# Altium footprint library LSCB.PcbLib: 64 footprints (part 3 of 4)
Each footprint in its own frame and in the unit in brackets; x right, y up, seen from the top. Pads: shape width x height; smd on the part's side, far side on the other; paste and mask are expansions set on the pad; w line width, h text height; cw(c..) or ccw(c..) is an arc to the next point about the centre after c.
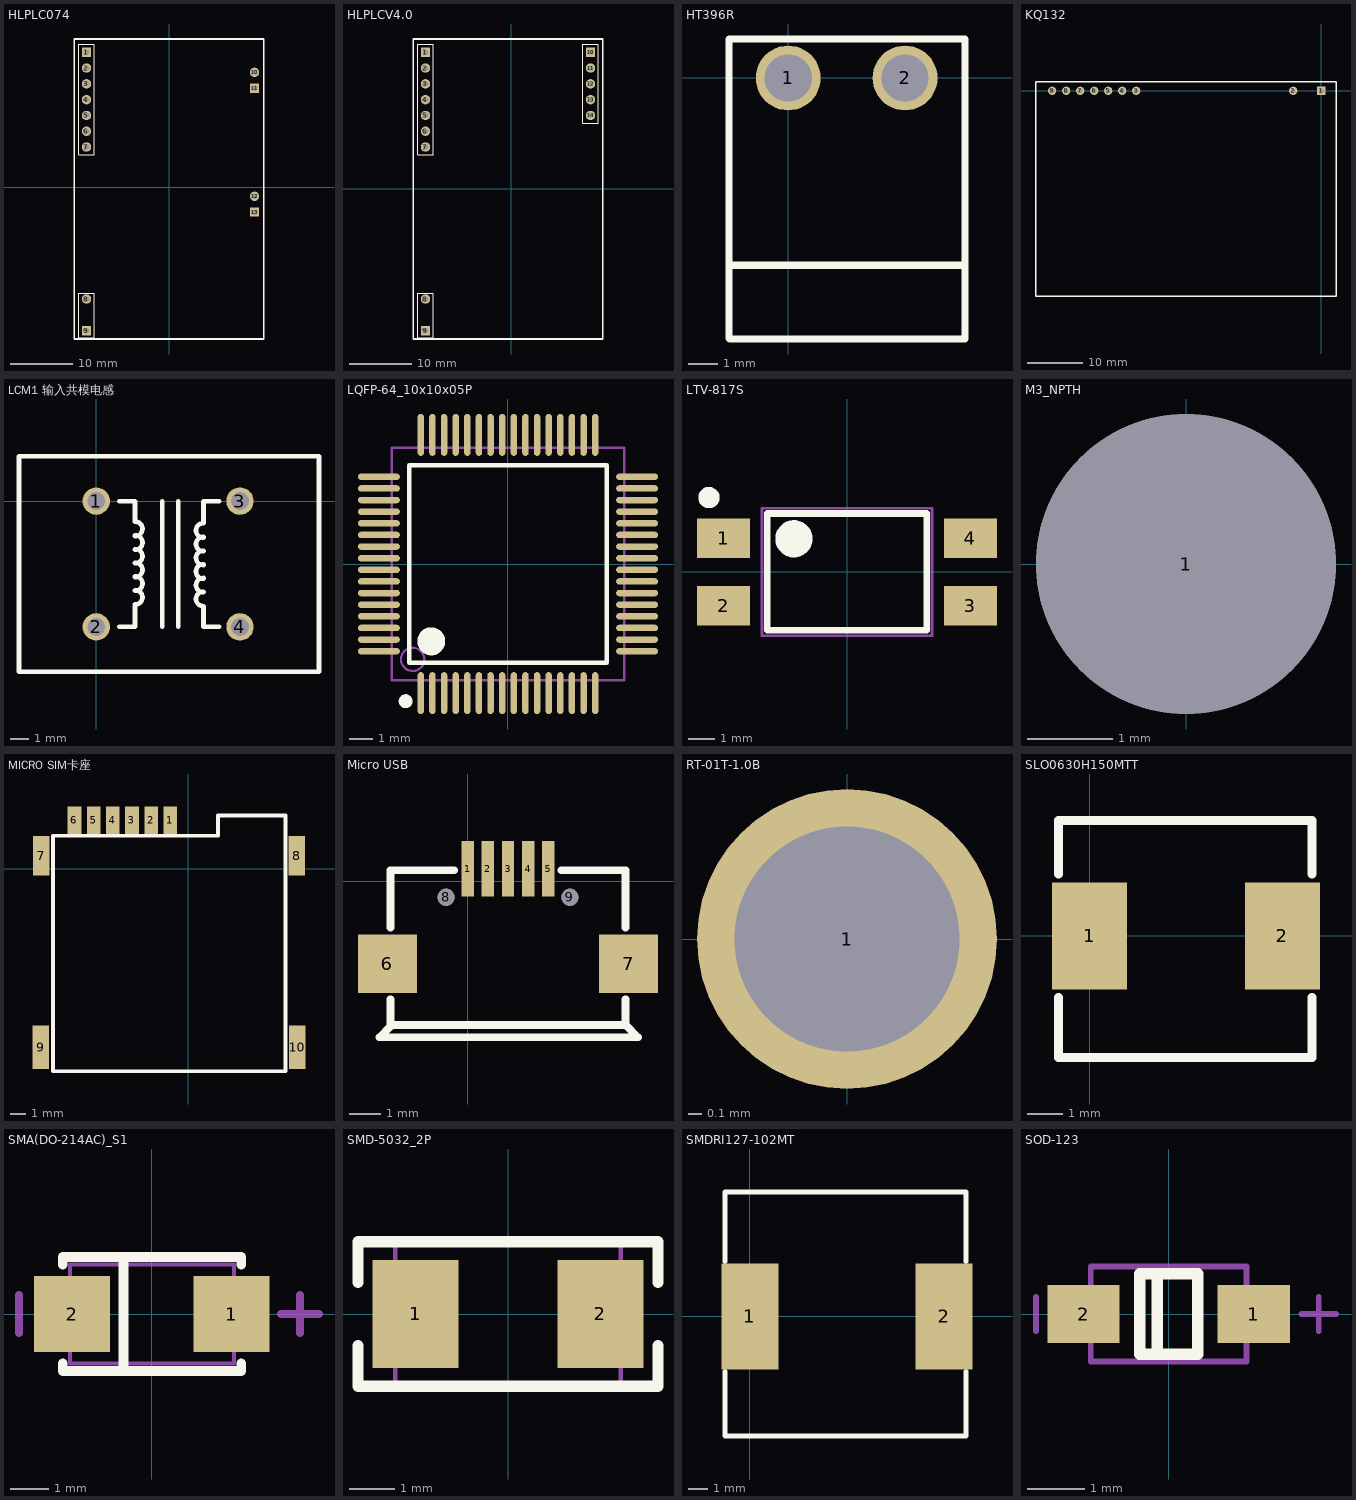
[diagram p2: the footprints below, top view; thin cyan lines are the x and y axes]

## HLPLC074 [mm]
pads (13):
  rect 1.5x1.5 hole 0.9: 1(-13.284,21.742) 9(-13.284,-23.038) 11(13.741,15.977) 13(13.741,-3.962)
  round 1.5 hole 0.9: 2(-13.284,19.202) 3(-13.284,16.662) 4(-13.284,14.122) 5(-13.284,11.582) 6(-13.284,9.042) 7(-13.284,6.502) 8(-13.284,-17.958) 10(13.741,18.517) 12(13.741,-1.422)
Top Overlay:
  lines w0.2: -14.554,-24.206 -14.554,-17.018 -12.014,-17.018 -12.014,-24.206 -14.554,-24.206 ; -14.554,5.232 -12.014,5.232 -12.014,23.012 -14.554,23.012 -14.554,5.232
  lines w0.254: -15.265,-24.384 -15.265,23.876 15.24,23.876 15.24,-24.384 -15.265,-24.384
Bottom Overlay:
  lines w0.2: 12.471,-5.232 15.011,-5.232 15.011,-0.152 12.471,-0.152 12.471,-5.232 ; 12.471,14.707 15.011,14.707 15.011,19.787 12.471,19.787 12.471,14.707

## HLPLCV4.0 [mm]
pads (14):
  rect 1.5x1.5 hole 0.9: 1(-13.792,21.996) 9(-13.792,-22.784) 10(12.751,21.996)
  round 1.5 hole 0.9: 2(-13.792,19.456) 3(-13.792,16.916) 4(-13.792,14.376) 5(-13.792,11.836) 6(-13.792,9.296) 7(-13.792,6.756) 8(-13.792,-17.704) 11(12.751,19.456) 12(12.751,16.916) 13(12.751,14.376) 14(12.751,11.836)
Top Overlay:
  lines w0.2: -15.062,-23.952 -12.522,-23.952 -12.522,-16.764 -15.062,-16.764 -15.062,-23.952 ; -15.062,5.486 -15.062,23.266 -12.522,23.266 -12.522,5.486 -15.062,5.486 ; 11.481,10.566 11.481,23.266 14.021,23.266 14.021,10.566 11.481,10.566
  lines w0.254: -15.773,-24.13 14.732,-24.13 14.732,24.13 -15.773,24.13 -15.773,-24.13

## HT396R [mm] "3.96mm 2p"
pads (2):
  round 2.2 hole 1.6: 1(0,0) 2(3.96,0)
Top Overlay:
  lines w0.254: -1.981,-6.35 5.944,-6.35 ; -2.007,-8.823 -1.986,-8.844 5.99,-8.844 5.99,1.321 -2.007,1.321 -2.007,-8.823

## KQ132 [mm]
pads (9):
  rect 1.5x1.5 hole 0.9: 1(0,0)
  round 1.5 hole 0.9: 2(-5.08,0) 3(-33.528,0) 4(-36.068,0) 5(-38.608,0) 6(-41.148,0) 7(-43.688,0) 8(-46.228,0) 9(-48.768,0)
Top Overlay:
  lines w0.254: -51.689,-37.226 -51.689,1.636 2.667,1.636 2.667,-37.226 -51.689,-37.226
3D body "KQ130F.SLDPRT": height 17.1, standoff -3, extent -50.535,-36.166 2.465,1.834

## LCM1 输入共模电感 [mm]
pads (4):
  round 1.524 hole 1: 1(0,0) 2(0,-7) 3(8,0) 4(8,-7)
Top Overlay:
  lines w0.254: 1.27,-6.985 2.159,-6.985 2.159,-5.842 ; 1.27,0 2.159,0 2.159,-1.143 cw(c2.176,-1.543) 2.157,-1.942 ; 2.157,-5.752 ccw(c2.176,-5.353) 2.159,-4.953 ; 2.157,-4.99 ccw(c2.176,-4.591) 2.159,-4.191 ; 2.157,-4.228 ccw(c2.176,-3.829) 2.159,-3.429 ; 2.157,-3.466 ccw(c2.176,-3.067) 2.159,-2.667 ; 2.157,-2.704 ccw(c2.176,-2.305) 2.159,-1.905 ; 3.683,-6.985 3.683,0 ; 4.572,-6.985 4.572,0 ; 5.969,-5.08 cw(c5.952,-4.68) 5.971,-4.281 ; 5.969,-4.318 cw(c5.952,-3.918) 5.971,-3.519 ; 5.969,-3.556 cw(c5.952,-3.156) 5.971,-2.757 ; 5.969,-2.794 cw(c5.952,-2.394) 5.971,-1.995 ; 5.969,-2.032 cw(c5.952,-1.632) 5.971,-1.233 ; 5.969,-1.143 5.969,0 6.858,0 ; 5.971,-5.043 ccw(c5.952,-5.442) 5.969,-5.842 5.969,-6.985 6.858,-6.985 ; -4.3,-9.5 12.4,-9.5 12.4,2.5 -4.3,2.5 -4.3,-9.5
3D body "User Library-UF9_8.SLDPRT": height 15.3, standoff -3, extent -4.064,-8.729 12.09,1.871

## LQFP-64_10x10x05P [mm]
pads (64):
  oval 0.28x1.8 smd mask+0.051: 1(-3.75,-5.55) 2(-3.25,-5.55) 3(-2.75,-5.55) 4(-2.25,-5.55) 5(-1.75,-5.55) 6(-1.25,-5.55) 7(-0.75,-5.55) 8(-0.25,-5.55) 9(0.25,-5.55) 10(0.75,-5.55) 11(1.25,-5.55) 12(1.75,-5.55) 13(2.25,-5.55) 14(2.75,-5.55) 15(3.25,-5.55) 16(3.75,-5.55) 33(3.75,5.55) 34(3.25,5.55) 35(2.75,5.55) 36(2.25,5.55) 37(1.75,5.55) 38(1.25,5.55) 39(0.75,5.55) 40(0.25,5.55) 41(-0.25,5.55) 42(-0.75,5.55) 43(-1.25,5.55) 44(-1.75,5.55) 45(-2.25,5.55) 46(-2.75,5.55) 47(-3.25,5.55) 48(-3.75,5.55)
  oval 1.8x0.28 smd mask+0.051: 17(5.55,-3.75) 18(5.55,-3.25) 19(5.55,-2.75) 20(5.55,-2.25) 21(5.55,-1.75) 22(5.55,-1.25) 23(5.55,-0.75) 24(5.55,-0.25) 25(5.55,0.25) 26(5.55,0.75) 27(5.55,1.25) 28(5.55,1.75) 29(5.55,2.25) 30(5.55,2.75) 31(5.55,3.25) 32(5.55,3.75) 49(-5.55,3.75) 50(-5.55,3.25) 51(-5.55,2.75) 52(-5.55,2.25) 53(-5.55,1.75) 54(-5.55,1.25) 55(-5.55,0.75) 56(-5.55,0.25) 57(-5.55,-0.25) 58(-5.55,-0.75) 59(-5.55,-1.25) 60(-5.55,-1.75) 61(-5.55,-2.25) 62(-5.55,-2.75) 63(-5.55,-3.25) 64(-5.55,-3.75)
Top Overlay:
  circle w0.6: c-3.3,-3.325 r0.3
  circle w0.3: c-4.4,-5.9 r0.15
  lines w0.2: -4.25,-4.25 -4.25,4.25 4.25,4.25 4.25,-4.25 -4.25,-4.25
Mechanical 13:
  circle w0.1: c-4.1,-4.1 r0.5
  lines w0.1: -5,-5 -5,5 5,5 5,-5 -5,-5
3D body "ST LQFP-64-10x10.STEP": height 1.6, standoff 0, extent -6.01,-6.01 6.011,6.011

## LTV-817S [mm] "光耦"
pads (4):
  rect 2x1.5 smd: 1(-4.65,1.27) 2(-4.65,-1.27) 3(4.65,-1.27) 4(4.65,1.27)
Top Overlay:
  circle w0.4: c-5.2,2.8 r0.2
  circle w0.7: c-2,1.25 r0.35
  lines w0.254: -3,-2.2 -3,2.2 3,2.2 3,-2.2 -3,-2.2
Mechanical 13:
  lines w0.1: -3.2,-2.4 3.2,-2.4 3.2,2.4 -3.2,2.4 -3.2,-2.4
3D body "User Library-DIP4_opto_iso.STEP": height 3.9, standoff 0, extent -5.015,-2.416 5.015,2.416

## M3_NPTH [mm]
pads (1):
  round 3.5 hole 3.5 unplated: 1(0,0)

## MICRO SIM卡座 [mm]
pads (10):
  rect 0.9x1.8 smd: 1(-1.2,3.2) 2(-2.47,3.2) 3(-3.74,3.2) 4(-5.01,3.2) 5(-6.28,3.2) 6(-7.55,3.2)
  rect 1.1x2.6 smd: 7(-9.75,0.85) 8(7.175,0.85)
  rect 1.1x2.9 smd: 9(-9.775,-11.83) 10(7.2,-11.83)
Top Overlay:
  lines w0.254: 6.375,-13.425 -8.975,-13.425 -8.975,2.175 1.95,2.175 1.95,3.525 6.425,3.525 6.425,-13.425

## Micro USB [mm]
pads (9):
  rect 0.4x1.8 smd: 1(0,0.4) 2(0.65,0.4) 3(1.3,0.4) 4(1.95,0.4) 5(2.6,0.4)
  rect 1.9x1.9 smd: 6(-2.6,-2.675) 7(5.2,-2.675)
  round 0.55 hole 0.55 unplated: 8(-0.7,-0.525) 9(3.3,-0.525)
Top Overlay:
  lines w0.254: -2.5,-3.825 -2.5,-4.65 ; -2.5,-1.5 -2.5,0.35 -0.45,0.35 ; 3.025,0.35 5.1,0.35 5.1,-1.5 ; 5.1,-3.825 5.1,-4.65 ; -2.5,-4.65 5.1,-4.65 ; -2.5,-4.65 -2.5,-4.7 -2.85,-5.05 5.5,-5.05 5.1,-4.65

## RT-01T-1.0B [mm] "功率插针"
pads (1):
  round 2.2 hole 1.65: 1(0,0)

## SLO0630H150MTT [mm]
height 3
pads (2):
  rect 2.1x3 smd: 1(0,0) 2(5.4,0)
Top Overlay:
  lines w0.254: -0.867,-1.727 -0.867,-3.4 6.233,-3.4 6.233,-1.727 ; -0.867,1.727 -0.867,3.226 6.233,3.226 6.233,1.727

## SMA(DO-214AC)_S1 [mm]
pads (2):
  rect 2x2 smd: 1(2.1,0) 2(-2.1,0)
Top Overlay:
  lines w0.254: -2.35,-1.3 -2.35,-1.5 2.35,-1.5 2.35,-1.3 ; -2.35,1.3 -2.35,1.5 2.35,1.5 2.35,1.3 ; -0.75,-1.5 -0.75,1.5
Mechanical 13:
  lines w0.1: -2.16,-1.3 -2.16,1.3 2.16,1.3 2.16,-1.3 -2.16,-1.3
Mechanical 15:
  lines w0.203: -3.5,-0.5 -3.5,0.5 ; 3.4,0 4.4,0 ; 3.9,-0.5 3.9,0.5
3D body "User Library-DO-214AC SMA.SLDPRT": height 2.4, standoff 0, extent -2.6,-1.3 2.6,1.3

## SMD-5032_2P [mm]
pads (2):
  rect 1.9x2.4 smd: 1(-2.05,0) 2(2.05,0)
Top Overlay:
  lines w0.254: -3.325,-0.7 -3.325,-1.6 3.325,-1.6 3.325,-0.7 ; -3.325,0.7 -3.325,1.6 3.325,1.6 3.325,0.7
Mechanical 13:
  lines w0.1: -2.5,-1.6 -2.5,1.6 2.5,1.6 2.5,-1.6 -2.5,-1.6
3D body "5032xtal.SLDPRT": height 1.3, standoff 0, extent -2.5,-1.6 2.5,1.6

## SMDRI127-102MT [mm] "1000uH ±20% 550mA"
pads (2):
  rect 2.9x5.4 smd: 1(0,0) 2(9.9,0)
Top Overlay:
  lines w0.254: -1.27,-2.794 -1.27,-6.096 10.776,-6.096 11.03,-6.096 11.03,-2.794 ; -1.27,2.794 -1.27,6.35 11.03,6.35 11.03,2.794

## SOD-123 [mm]
pads (2):
  rect 1.25x1 smd: 1(1.475,0) 2(-1.475,0)
Top Overlay:
  lines w0.2: -0.2,-0.7 -0.2,0.7 ; -0.5,-0.7 0.5,-0.7 0.5,0.7 -0.5,0.7 -0.5,-0.7
Mechanical 13:
  lines w0.1: -1.35,-0.825 -1.35,0.825 1.35,0.825 1.35,-0.825 -1.35,-0.825
Mechanical 15:
  lines w0.1: -2.3,-0.3 -2.3,0.3 ; 2.3,0 2.9,0 ; 2.6,-0.3 2.6,0.3
3D body "SOD123.STEP": height 1.35, standoff 0, extent -1.85,-0.775 1.85,0.775